# Altium footprint library texas.PCBLIB: 168 footprints (part 4 of 14)
Each footprint in its own frame and in the unit in brackets; x right, y up, seen from the top. Pads: shape width x height; smd on the part's side, far side on the other; paste and mask are expansions set on the pad; w line width, h text height; cw(c..) or ccw(c..) is an arc to the next point about the centre after c.
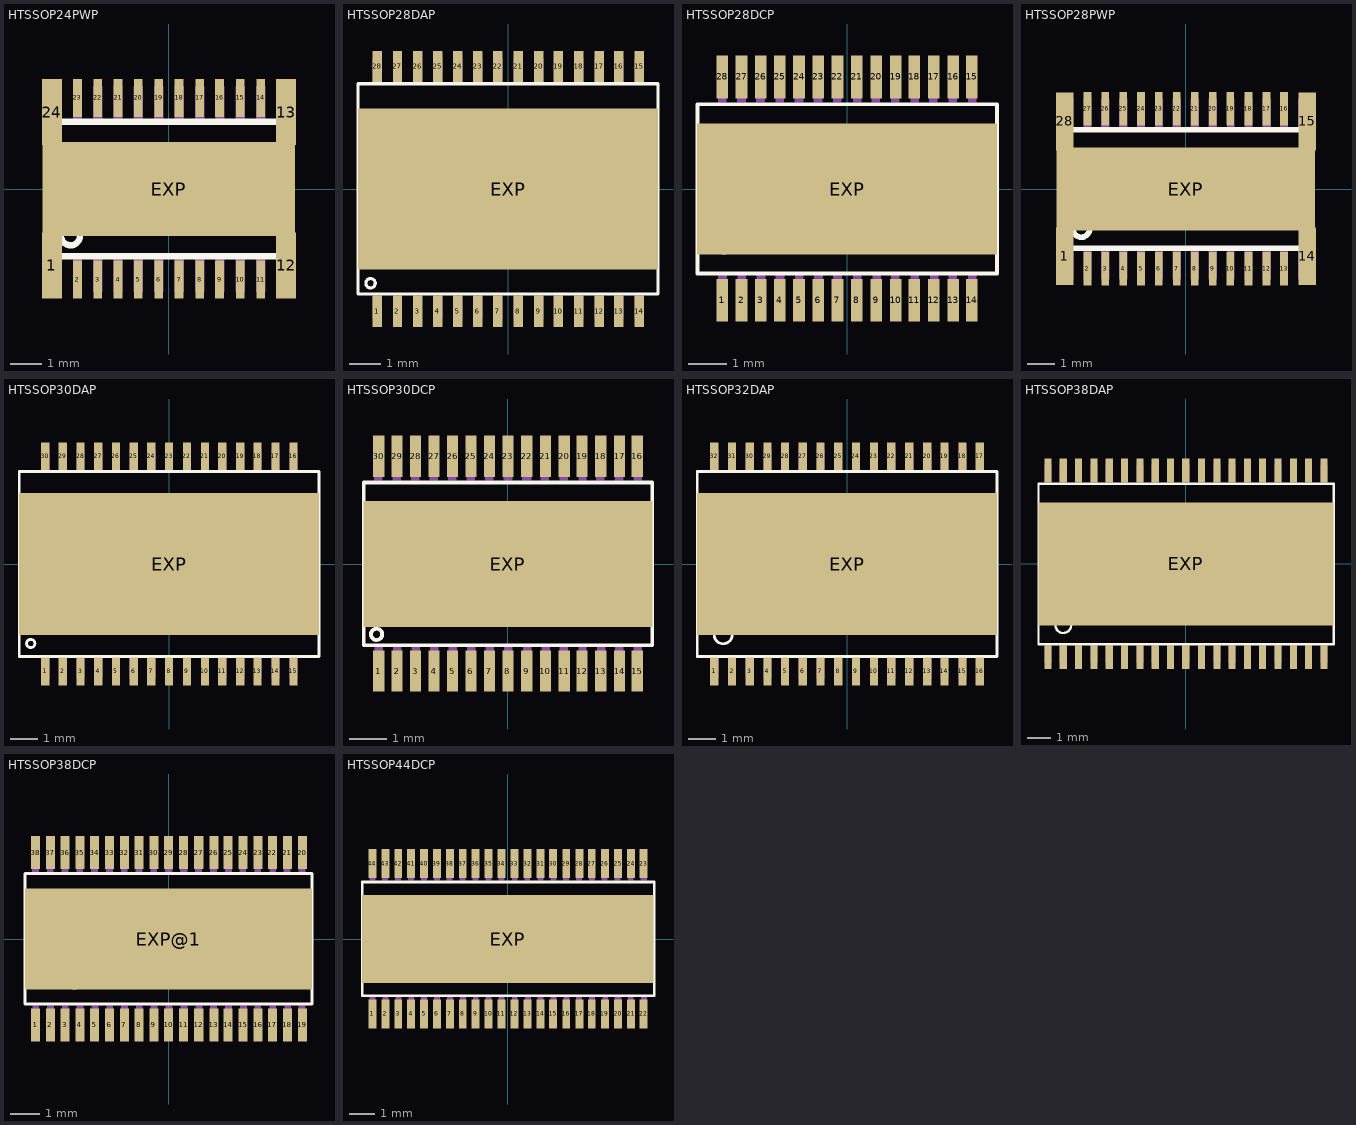
[diagram p3: the footprints below, top view; thin cyan lines are the x and y axes]

## HTSSOP24PWP [mil]
pads (25):
  rect 25x83 smd: 1(-147.44,-96.46) 12(148,-96.46) 13(148,97) 24(-147.44,97)
  rect 11x48 smd: 2(-115.16,-114.17) 3(-89.57,-114.17) 4(-63.98,-114.17) 5(-38.39,-114.17) 6(-12.8,-114.17) 7(13,-114.17) 8(39,-114.17) 9(64,-114.17) 10(90,-114.17) 11(116,-114.17) 14(116,115) 15(90,115) 16(64,115) 17(39,115) 18(13,115) 19(-12.8,115) 20(-38.39,115) 21(-63.98,115) 22(-89.57,115) 23(-115.16,115)
  rect 319x119 smd: EXP(0,0)
Top Overlay:
  circle w8: c-124.02,-59.06 r12
  lines w8: -151.57,-84.65 -151.57,85 152,85 152,-84.65 -151.57,-84.65
Top Paste:
  region: -135.83,138 -145.67,138 -145.67,91 -135.83,91
  region: -110.24,138 -120.08,138 -120.08,91 -110.24,91
  region: -84.65,138 -94.49,138 -94.49,91 -84.65,91
  region: -59.06,138 -68.9,138 -68.9,91 -59.06,91
  region: -33.46,138 -43.31,138 -43.31,91 -33.46,91
  region: -7.87,138 -17.72,138 -17.72,91 -7.87,91
  region: 18,138 8,138 8,91 18,91
  region: 44,138 34,138 34,91 44,91
  region: 69,138 60,138 60,91 69,91
  region: 95,138 85,138 85,91 95,91
  region: 121,138 111,138 111,91 121,91
  region: 146,138 136,138 136,91 146,91
  rectangle: 136,-137.01 146,-90.94
  rectangle: 111,-137.01 121,-90.94
  rectangle: 85,-137.01 95,-90.94
  rectangle: 60,-137.01 69,-90.94
  rectangle: 34,-137.01 44,-90.94
  rectangle: 8,-137.01 18,-90.94
  rectangle: -17.72,-137.01 -7.87,-90.94
  rectangle: -43.31,-137.01 -33.46,-90.94
  rectangle: -68.9,-137.01 -59.06,-90.94
  rectangle: -94.49,-137.01 -84.65,-90.94
  rectangle: -120.08,-137.01 -110.24,-90.94
  rectangle: -145.67,-137.01 -135.83,-90.94
  rectangle: -94.49,-47.24 95,48
Top Solder:
  rectangle: -100,-51.18 100,52
  region: -135.43,138 -146.06,138 -146.06,91 -135.43,91
  region: -109.84,138 -120.47,138 -120.47,91 -109.84,91
  region: -84.25,138 -94.88,138 -94.88,91 -84.25,91
  region: -58.66,138 -69.29,138 -69.29,91 -58.66,91
  region: -33.07,138 -43.7,138 -43.7,91 -33.07,91
  region: -7.48,138 -18.11,138 -18.11,91 -7.48,91
  region: 19,138 8,138 8,91 19,91
  region: 44,138 34,138 34,91 44,91
  region: 70,138 59,138 59,91 70,91
  region: 95,138 85,138 85,91 95,91
  region: 121,138 110,138 110,91 121,91
  region: 147,138 136,138 136,91 147,91
  rectangle: 136,-137.8 147,-90.55
  rectangle: 110,-137.8 121,-90.55
  rectangle: 85,-137.8 95,-90.55
  rectangle: 59,-137.8 70,-90.55
  rectangle: 34,-137.8 44,-90.55
  rectangle: 8,-137.8 19,-90.55
  rectangle: -18.11,-137.8 -7.48,-90.55
  rectangle: -43.7,-137.8 -33.07,-90.55
  rectangle: -69.29,-137.8 -58.66,-90.55
  rectangle: -94.88,-137.8 -84.25,-90.55
  rectangle: -120.47,-137.8 -109.84,-90.55
  rectangle: -146.06,-137.8 -135.43,-90.55
Mechanical 4:
  region: -134.84,130 -146.65,130 -146.65,87 -134.84,87
  region: -109.25,130 -121.06,130 -121.06,87 -109.25,87
  region: -83.66,130 -95.47,130 -95.47,87 -83.66,87
  region: -58.07,130 -69.88,130 -69.88,87 -58.07,87
  region: -32.48,130 -44.29,130 -44.29,87 -32.48,87
  region: -6.89,130 -18.7,130 -18.7,87 -6.89,87
  region: 19,130 7,130 7,87 19,87
  region: 45,130 33,130 33,87 45,87
  region: 70,130 59,130 59,87 70,87
  region: 96,130 84,130 84,87 96,87
  region: 122,130 110,130 110,87 122,87
  region: 147,130 135,130 135,87 147,87
  rectangle: 135,-129.92 147,-86.61
  rectangle: 110,-129.92 122,-86.61
  rectangle: 84,-129.92 96,-86.61
  rectangle: 59,-129.92 70,-86.61
  rectangle: 33,-129.92 45,-86.61
  rectangle: 7,-129.92 19,-86.61
  rectangle: -18.7,-129.92 -6.89,-86.61
  rectangle: -44.29,-129.92 -32.48,-86.61
  rectangle: -69.88,-129.92 -58.07,-86.61
  rectangle: -95.47,-129.92 -83.66,-86.61
  rectangle: -121.06,-129.92 -109.25,-86.61
  rectangle: -146.65,-129.92 -134.84,-86.61

## HTSSOP28DAP [mil]
pads (29):
  rect 12x40 smd: 1(-166.34,-155.51) 2(-140.75,-155.51) 3(-115.16,-155.51) 4(-89.57,-155.51) 5(-63.98,-155.51) 6(-38.39,-155.51) 7(-12.8,-155.51) 8(13,-155.51) 9(39,-155.51) 10(64,-155.51) 11(90,-155.51) 12(116,-155.51) 13(141,-155.51) 14(167,-155.51) 15(167,156) 16(141,156) 17(116,156) 18(90,156) 19(64,156) 20(39,156) 21(13,156) 22(-12.8,156) 23(-38.39,156) 24(-63.98,156) 25(-89.57,156) 26(-115.16,156) 27(-140.75,156) 28(-166.34,156)
  rect 382x205 smd: EXP(0,0)
Top Overlay:
  circle w4: c-175,-120 r6
  lines w4: -190.94,-133.86 -190.94,134 191,134 191,-133.86 -190.94,-133.86
Top Solder:
  rectangle: -190.94,-102.36 191,103
  region: -160.63,175 -172.05,175 -172.05,137 -160.63,137
  region: -160.04,176 -172.64,176 -172.64,136 -160.04,136
  region: -135.04,175 -146.46,175 -146.46,137 -135.04,137
  region: -134.45,176 -147.05,176 -147.05,136 -134.45,136
  region: -109.45,175 -120.87,175 -120.87,137 -109.45,137
  region: -108.86,176 -121.46,176 -121.46,136 -108.86,136
  region: -83.86,175 -95.28,175 -95.28,137 -83.86,137
  region: -83.27,176 -95.87,176 -95.87,136 -83.27,136
  region: -58.27,175 -69.69,175 -69.69,137 -58.27,137
  region: -57.68,176 -70.28,176 -70.28,136 -57.68,136
  region: -32.68,175 -44.09,175 -44.09,137 -32.68,137
  region: -32.09,176 -44.69,176 -44.69,136 -32.09,136
  region: -7.09,175 -18.5,175 -18.5,137 -7.09,137
  region: -6.5,176 -19.09,176 -19.09,136 -6.5,136
  region: 19,175 8,175 8,137 19,137
  region: 20,176 7,176 7,136 20,136
  region: 45,175 33,175 33,137 45,137
  region: 45,176 33,176 33,136 45,136
  region: 70,175 59,175 59,137 70,137
  region: 71,176 58,176 58,136 71,136
  region: 96,175 84,175 84,137 96,137
  region: 96,176 84,176 84,136 96,136
  region: 121,175 110,175 110,137 121,137
  region: 122,176 109,176 109,136 122,136
  region: 147,175 136,175 136,137 147,137
  region: 148,176 135,176 135,136 148,136
  region: 173,175 161,175 161,137 173,137
  region: 173,176 161,176 161,136 173,136
  rectangle: 161,-175 173,-136.02
  rectangle: 161,-175.59 173,-135.43
  rectangle: 136,-175 147,-136.02
  rectangle: 135,-175.59 148,-135.43
  rectangle: 110,-175 121,-136.02
  rectangle: 109,-175.59 122,-135.43
  rectangle: 84,-175 96,-136.02
  rectangle: 84,-175.59 96,-135.43
  rectangle: 59,-175 70,-136.02
  rectangle: 58,-175.59 71,-135.43
  rectangle: 33,-175 45,-136.02
  rectangle: 33,-175.59 45,-135.43
  rectangle: 8,-175 19,-136.02
  rectangle: 7,-175.59 20,-135.43
  rectangle: -18.5,-175 -7.09,-136.02
  rectangle: -19.09,-175.59 -6.5,-135.43
  rectangle: -44.09,-175 -32.68,-136.02
  rectangle: -44.69,-175.59 -32.09,-135.43
  rectangle: -69.69,-175 -58.27,-136.02
  rectangle: -70.28,-175.59 -57.68,-135.43
  rectangle: -95.28,-175 -83.86,-136.02
  rectangle: -95.87,-175.59 -83.27,-135.43
  rectangle: -120.87,-175 -109.45,-136.02
  rectangle: -121.46,-175.59 -108.86,-135.43
  rectangle: -146.46,-175 -135.04,-136.02
  rectangle: -147.05,-175.59 -134.45,-135.43
  rectangle: -172.05,-175 -160.63,-136.02
  rectangle: -172.64,-175.59 -160.04,-135.43
Mechanical 4:
  region: -160.43,166 -172.24,166 -172.24,136 -160.43,136
  region: -134.84,166 -146.65,166 -146.65,136 -134.84,136
  region: -109.25,166 -121.06,166 -121.06,136 -109.25,136
  region: -83.66,166 -95.47,166 -95.47,136 -83.66,136
  region: -58.07,166 -69.88,166 -69.88,136 -58.07,136
  region: -32.48,166 -44.29,166 -44.29,136 -32.48,136
  region: -6.89,166 -18.7,166 -18.7,136 -6.89,136
  region: 19,166 7,166 7,136 19,136
  region: 45,166 33,166 33,136 45,136
  region: 70,166 59,166 59,136 70,136
  region: 96,166 84,166 84,136 96,136
  region: 122,166 110,166 110,136 122,136
  region: 147,166 135,166 135,136 147,136
  region: 173,166 161,166 161,136 173,136
  rectangle: 161,-165.35 173,-135.83
  rectangle: 135,-165.35 147,-135.83
  rectangle: 110,-165.35 122,-135.83
  rectangle: 84,-165.35 96,-135.83
  rectangle: 59,-165.35 70,-135.83
  rectangle: 33,-165.35 45,-135.83
  rectangle: 7,-165.35 19,-135.83
  rectangle: -18.7,-165.35 -6.89,-135.83
  rectangle: -44.29,-165.35 -32.48,-135.83
  rectangle: -69.88,-165.35 -58.07,-135.83
  rectangle: -95.47,-165.35 -83.66,-135.83
  rectangle: -121.06,-165.35 -109.25,-135.83
  rectangle: -146.65,-165.35 -134.84,-135.83
  rectangle: -172.24,-165.35 -160.43,-135.83

## HTSSOP28DCP [mil]
pads (29):
  rect 12x44 smd: 1(-127.95,-114.17) 2(-108.27,-114.17) 3(-88.58,-114.17) 4(-68.9,-114.17) 5(-49.21,-114.17) 6(-29.53,-114.17) 7(-9.84,-114.17) 8(10,-114.17) 9(30,-114.17) 10(50,-114.17) 11(69,-114.17) 12(89,-114.17) 13(109,-114.17) 14(128,-114.17) 15(128,115) 16(109,115) 17(89,115) 18(69,115) 19(50,115) 20(30,115) 21(10,115) 22(-9.84,115) 23(-29.53,115) 24(-49.21,115) 25(-68.9,115) 26(-88.58,115) 27(-108.27,115) 28(-127.95,115)
  rect 308x134 smd: EXP(0,0)
Top Overlay:
  circle w4: c-125.79,-53.15 r12
  lines w4: -153.54,-86.61 154,-86.61 154,87 -153.54,87 -153.54,-86.61
Top Paste:
  rectangle: -133.46,-135.24 -122.44,-93.11
  rectangle: -113.78,-135.24 -102.76,-93.11
  rectangle: -94.09,-135.24 -83.07,-93.11
  rectangle: -74.41,-135.24 -63.39,-93.11
  rectangle: -54.72,-135.24 -43.7,-93.11
  rectangle: -35.04,-135.24 -24.02,-93.11
  rectangle: -15.35,-135.24 -4.33,-93.11
  rectangle: 5,-135.24 16,-93.11
  rectangle: 25,-135.24 36,-93.11
  rectangle: 44,-135.24 55,-93.11
  rectangle: 64,-135.24 75,-93.11
  rectangle: 84,-135.24 95,-93.11
  rectangle: 103,-135.24 114,-93.11
  rectangle: 123,-135.24 134,-93.11
  region: 134,136 123,136 123,94 134,94
  region: 114,136 103,136 103,94 114,94
  region: 95,136 84,136 84,94 95,94
  region: 75,136 64,136 64,94 75,94
  region: 55,136 44,136 44,94 55,94
  region: 36,136 25,136 25,94 36,94
  region: 16,136 5,136 5,94 16,94
  region: -4.33,136 -15.35,136 -15.35,94 -4.33,94
  region: -24.02,136 -35.04,136 -35.04,94 -24.02,94
  region: -43.7,136 -54.72,136 -54.72,94 -43.7,94
  region: -63.39,136 -74.41,136 -74.41,94 -63.39,94
  region: -83.07,136 -94.09,136 -94.09,94 -83.07,94
  region: -102.76,136 -113.78,136 -113.78,94 -102.76,94
  region: -122.44,136 -133.46,136 -133.46,94 -122.44,94
Top Solder:
  rectangle: -134.06,-136.02 -121.85,-92.32
  rectangle: -114.37,-136.02 -102.17,-92.32
  rectangle: -94.69,-136.02 -82.48,-92.32
  rectangle: -75,-136.02 -62.8,-92.32
  rectangle: -55.31,-136.02 -43.11,-92.32
  rectangle: -35.63,-136.02 -23.43,-92.32
  rectangle: -15.94,-136.02 -3.74,-92.32
  rectangle: 4,-136.02 16,-92.32
  rectangle: 24,-136.02 36,-92.32
  rectangle: 44,-136.02 56,-92.32
  rectangle: 63,-136.02 75,-92.32
  rectangle: 83,-136.02 95,-92.32
  rectangle: 103,-136.02 115,-92.32
  rectangle: 122,-136.02 135,-92.32
  region: 135,137 122,137 122,93 135,93
  region: 115,137 103,137 103,93 115,93
  region: 95,137 83,137 83,93 95,93
  region: 75,137 63,137 63,93 75,93
  region: 56,137 44,137 44,93 56,93
  region: 36,137 24,137 24,93 36,93
  region: 16,137 4,137 4,93 16,93
  region: -3.74,137 -15.94,137 -15.94,93 -3.74,93
  region: -23.43,137 -35.63,137 -35.63,93 -23.43,93
  region: -43.11,137 -55.31,137 -55.31,93 -43.11,93
  region: -62.8,137 -75,137 -75,93 -62.8,93
  region: -82.48,137 -94.69,137 -94.69,93 -82.48,93
  region: -102.17,137 -114.37,137 -114.37,93 -102.17,93
  region: -121.85,137 -134.06,137 -134.06,93 -121.85,93
  rectangle: -153.35,-66.93 154,67
Mechanical 4:
  rectangle: -132.28,-129.92 -123.23,-88.39
  rectangle: -112.6,-129.92 -103.54,-88.39
  rectangle: -92.91,-129.92 -83.86,-88.39
  rectangle: -73.23,-129.92 -64.17,-88.39
  rectangle: -53.54,-129.92 -44.49,-88.39
  rectangle: -33.86,-129.92 -24.8,-88.39
  rectangle: -14.17,-129.92 -5.12,-88.39
  rectangle: 6,-129.92 15,-88.39
  rectangle: 26,-129.92 35,-88.39
  rectangle: 45,-129.92 54,-88.39
  rectangle: 65,-129.92 74,-88.39
  rectangle: 85,-129.92 94,-88.39
  rectangle: 104,-129.92 113,-88.39
  rectangle: 124,-129.92 133,-88.39
  region: 133,130 124,130 124,89 133,89
  region: 113,130 104,130 104,89 113,89
  region: 93,130 84,130 84,89 93,89
  region: 74,130 65,130 65,89 74,89
  region: 54,130 45,130 45,89 54,89
  region: 34,130 25,130 25,89 34,89
  region: 15,130 6,130 6,89 15,89
  region: -5.51,130 -14.57,130 -14.57,89 -5.51,89
  region: -25.2,130 -34.25,130 -34.25,89 -25.2,89
  region: -44.88,130 -53.94,130 -53.94,89 -44.88,89
  region: -64.57,130 -73.62,130 -73.62,89 -64.57,89
  region: -84.25,130 -93.31,130 -93.31,89 -84.25,89
  region: -103.94,130 -112.99,130 -112.99,89 -103.94,89
  region: -123.62,130 -132.68,130 -132.68,89 -123.62,89

## HTSSOP28PWP [mil]
pads (29):
  rect 25x83 smd: 1(-173.03,-96.46) 14(174,-96.46) 15(174,97) 28(-173.03,97)
  rect 11x48 smd: 2(-140.75,-114.17) 3(-115.16,-114.17) 4(-89.57,-114.17) 5(-63.98,-114.17) 6(-38.39,-114.17) 7(-12.8,-114.17) 8(13,-114.17) 9(39,-114.17) 10(64,-114.17) 11(90,-114.17) 12(116,-114.17) 13(141,-114.17) 16(141,115) 17(116,115) 18(90,115) 19(64,115) 20(39,115) 21(13,115) 22(-12.8,115) 23(-38.39,115) 24(-63.98,115) 25(-89.57,115) 26(-115.16,115) 27(-140.75,115)
  rect 371x119 smd: EXP(0,0)
Top Overlay:
  circle w8: c-149.61,-57.09 r12
  lines w8: -177.17,-84.65 178,-84.65 178,85 -177.17,85 -177.17,-84.65
Top Paste:
  rectangle: -171.26,-137.01 -161.42,-90.94
  rectangle: -145.67,-137.01 -135.83,-90.94
  rectangle: -120.08,-137.01 -110.24,-90.94
  rectangle: -94.49,-137.01 -84.65,-90.94
  rectangle: -68.9,-137.01 -59.06,-90.94
  rectangle: -43.31,-137.01 -33.46,-90.94
  rectangle: -17.72,-137.01 -7.87,-90.94
  rectangle: 8,-137.01 18,-90.94
  rectangle: 34,-137.01 44,-90.94
  rectangle: 60,-137.01 69,-90.94
  rectangle: 85,-137.01 95,-90.94
  rectangle: 111,-137.01 121,-90.94
  rectangle: 136,-137.01 146,-90.94
  rectangle: 162,-137.01 172,-90.94
  region: 172,138 162,138 162,91 172,91
  region: 146,138 136,138 136,91 146,91
  region: 121,138 111,138 111,91 121,91
  region: 95,138 85,138 85,91 95,91
  region: 69,138 60,138 60,91 69,91
  region: 44,138 34,138 34,91 44,91
  region: 18,138 8,138 8,91 18,91
  region: -7.87,138 -17.72,138 -17.72,91 -7.87,91
  region: -33.46,138 -43.31,138 -43.31,91 -33.46,91
  region: -59.06,138 -68.9,138 -68.9,91 -59.06,91
  region: -84.65,138 -94.49,138 -94.49,91 -84.65,91
  region: -110.24,138 -120.08,138 -120.08,91 -110.24,91
  region: -135.83,138 -145.67,138 -145.67,91 -135.83,91
  region: -161.42,138 -171.26,138 -171.26,91 -161.42,91
  rectangle: -122.05,-39.37 123,40
Top Solder:
  rectangle: -171.65,-137.8 -161.02,-90.55
  rectangle: -146.06,-137.8 -135.43,-90.55
  rectangle: -120.47,-137.8 -109.84,-90.55
  rectangle: -94.88,-137.8 -84.25,-90.55
  rectangle: -69.29,-137.8 -58.66,-90.55
  rectangle: -43.7,-137.8 -33.07,-90.55
  rectangle: -18.11,-137.8 -7.48,-90.55
  rectangle: 8,-137.8 19,-90.55
  rectangle: 34,-137.8 44,-90.55
  rectangle: 59,-137.8 70,-90.55
  rectangle: 85,-137.8 95,-90.55
  rectangle: 162,-137.8 172,-90.55
  region: 172,138 162,138 162,91 172,91
  region: 95,138 85,138 85,91 95,91
  region: 70,138 59,138 59,91 70,91
  region: 44,138 34,138 34,91 44,91
  region: 19,138 8,138 8,91 19,91
  region: -7.48,138 -18.11,138 -18.11,91 -7.48,91
  region: -33.07,138 -43.7,138 -43.7,91 -33.07,91
  region: -58.66,138 -69.29,138 -69.29,91 -58.66,91
  region: -84.25,138 -94.88,138 -94.88,91 -84.25,91
  region: -109.84,138 -120.47,138 -120.47,91 -109.84,91
  region: -135.43,138 -146.06,138 -146.06,91 -135.43,91
  region: -161.02,138 -171.65,138 -171.65,91 -161.02,91
  rectangle: -125.59,-43.31 126,44
  region: 121,138 110,138 110,91 121,91
  rectangle: 110,-137.8 121,-90.55
  region: 147,138 136,138 136,91 147,91
  rectangle: 136,-137.8 147,-90.55
Mechanical 4:
  rectangle: -172.24,-129.92 -160.43,-86.61
  rectangle: -146.65,-129.92 -134.84,-86.61
  rectangle: -121.06,-129.92 -109.25,-86.61
  rectangle: -95.47,-129.92 -83.66,-86.61
  rectangle: -69.88,-129.92 -58.07,-86.61
  rectangle: -44.29,-129.92 -32.48,-86.61
  rectangle: -18.7,-129.92 -6.89,-86.61
  rectangle: 7,-129.92 19,-86.61
  rectangle: 33,-129.92 45,-86.61
  rectangle: 59,-129.92 70,-86.61
  rectangle: 84,-129.92 96,-86.61
  rectangle: 161,-129.92 173,-86.61
  region: 173,130 161,130 161,87 173,87
  region: -160.43,130 -172.24,130 -172.24,87 -160.43,87
  rectangle: 110,-129.92 122,-86.61
  rectangle: 135,-129.92 147,-86.61
  region: 147,130 135,130 135,87 147,87
  region: 122,130 110,130 110,87 122,87
  region: 96,130 84,130 84,87 96,87
  region: 70,130 59,130 59,87 70,87
  region: 45,130 33,130 33,87 45,87
  region: 19,130 7,130 7,87 19,87
  region: -6.89,130 -18.7,130 -18.7,87 -6.89,87
  region: -32.48,130 -44.29,130 -44.29,87 -32.48,87
  region: -58.07,130 -69.88,130 -69.88,87 -58.07,87
  region: -83.66,130 -95.47,130 -95.47,87 -83.66,87
  region: -109.25,130 -121.06,130 -121.06,87 -109.25,87
  region: -134.84,130 -146.65,130 -146.65,87 -134.84,87

## HTSSOP30DAP [mil]
pads (31):
  rect 12x40 smd: 1(-179.13,-155.51) 2(-153.54,-155.51) 3(-127.95,-155.51) 4(-102.36,-155.51) 5(-76.77,-155.51) 6(-51.18,-155.51) 7(-25.59,-155.51) 8(0,-155.51) 9(26,-155.51) 10(52,-155.51) 11(77,-155.51) 12(103,-155.51) 13(128,-155.51) 14(154,-155.51) 15(180,-155.51) 16(180,156) 17(154,156) 18(128,156) 19(103,156) 20(77,156) 21(52,156) 22(26,156) 23(0,156) 24(-25.59,156) 25(-51.18,156) 26(-76.77,156) 27(-102.36,156) 28(-127.95,156) 29(-153.54,156) 30(-179.13,156)
  rect 434x205 smd: EXP(0,0)
Top Overlay:
  circle w4: c-200,-115 r6
  lines w4: -216.54,-133.86 217,-133.86 217,134 -216.54,134 -216.54,-133.86
Top Solder:
  rectangle: -185.43,-175.59 -172.83,-135.43
  rectangle: -184.84,-175 -173.43,-136.02
  rectangle: -159.84,-175.59 -147.24,-135.43
  rectangle: -159.25,-175 -147.83,-136.02
  rectangle: -134.25,-175.59 -121.65,-135.43
  rectangle: -133.66,-175 -122.24,-136.02
  rectangle: -108.66,-175.59 -96.06,-135.43
  rectangle: -108.07,-175 -96.65,-136.02
  rectangle: -83.07,-175.59 -70.47,-135.43
  rectangle: -82.48,-175 -71.06,-136.02
  rectangle: -57.48,-175.59 -44.88,-135.43
  rectangle: -56.89,-175 -45.47,-136.02
  rectangle: -31.89,-175.59 -19.29,-135.43
  rectangle: -31.3,-175 -19.88,-136.02
  rectangle: -6.3,-175.59 7,-135.43
  rectangle: -5.71,-175 6,-136.02
  rectangle: 20,-175.59 32,-135.43
  rectangle: 20,-175 32,-136.02
  rectangle: 45,-175.59 58,-135.43
  rectangle: 46,-175 57,-136.02
  rectangle: 71,-175.59 84,-135.43
  rectangle: 72,-175 83,-136.02
  rectangle: 97,-175.59 109,-135.43
  rectangle: 97,-175 109,-136.02
  rectangle: 122,-175.59 135,-135.43
  rectangle: 123,-175 134,-136.02
  rectangle: 148,-175.59 160,-135.43
  rectangle: 148,-175 160,-136.02
  rectangle: 173,-175.59 186,-135.43
  rectangle: 174,-175 185,-136.02
  region: 186,176 173,176 173,136 186,136
  region: 185,175 174,175 174,137 185,137
  region: 160,176 148,176 148,136 160,136
  region: 160,175 148,175 148,137 160,137
  region: 135,176 122,176 122,136 135,136
  region: 134,175 123,175 123,137 134,137
  region: 109,176 97,176 97,136 109,136
  region: 109,175 97,175 97,137 109,137
  region: 84,176 71,176 71,136 84,136
  region: 83,175 72,175 72,137 83,137
  region: 58,176 45,176 45,136 58,136
  region: 57,175 46,175 46,137 57,137
  region: 32,176 20,176 20,136 32,136
  region: 32,175 20,175 20,137 32,137
  region: 7,176 -6.3,176 -6.3,136 7,136
  region: 6,175 -5.71,175 -5.71,137 6,137
  region: -19.29,176 -31.89,176 -31.89,136 -19.29,136
  region: -19.88,175 -31.3,175 -31.3,137 -19.88,137
  region: -44.88,176 -57.48,176 -57.48,136 -44.88,136
  region: -45.47,175 -56.89,175 -56.89,137 -45.47,137
  region: -70.47,176 -83.07,176 -83.07,136 -70.47,136
  region: -71.06,175 -82.48,175 -82.48,137 -71.06,137
  region: -96.06,176 -108.66,176 -108.66,136 -96.06,136
  region: -96.65,175 -108.07,175 -108.07,137 -96.65,137
  region: -121.65,176 -134.25,176 -134.25,136 -121.65,136
  region: -122.24,175 -133.66,175 -133.66,137 -122.24,137
  region: -147.24,176 -159.84,176 -159.84,136 -147.24,136
  region: -147.83,175 -159.25,175 -159.25,137 -147.83,137
  region: -172.83,176 -185.43,176 -185.43,136 -172.83,136
  region: -173.43,175 -184.84,175 -184.84,137 -173.43,137
  rectangle: -216.54,-102.36 217,103
Mechanical 4:
  rectangle: -185.04,-165.35 -173.23,-135.83
  rectangle: -159.45,-165.35 -147.64,-135.83
  rectangle: -133.86,-165.35 -122.05,-135.83
  rectangle: -108.27,-165.35 -96.46,-135.83
  rectangle: -82.68,-165.35 -70.87,-135.83
  rectangle: -57.09,-165.35 -45.28,-135.83
  rectangle: -31.5,-165.35 -19.68,-135.83
  rectangle: -5.91,-165.35 6,-135.83
  rectangle: 20,-165.35 32,-135.83
  rectangle: 46,-165.35 58,-135.83
  rectangle: 71,-165.35 83,-135.83
  rectangle: 97,-165.35 109,-135.83
  rectangle: 123,-165.35 134,-135.83
  rectangle: 148,-165.35 160,-135.83
  rectangle: 174,-165.35 186,-135.83
  region: 186,166 174,166 174,136 186,136
  region: 160,166 148,166 148,136 160,136
  region: 134,166 123,166 123,136 134,136
  region: 109,166 97,166 97,136 109,136
  region: 83,166 71,166 71,136 83,136
  region: 58,166 46,166 46,136 58,136
  region: 32,166 20,166 20,136 32,136
  region: 6,166 -5.91,166 -5.91,136 6,136
  region: -19.68,166 -31.5,166 -31.5,136 -19.69,136
  region: -45.28,166 -57.09,166 -57.09,136 -45.28,136
  region: -70.87,166 -82.68,166 -82.68,136 -70.87,136
  region: -96.46,166 -108.27,166 -108.27,136 -96.46,136
  region: -122.05,166 -133.86,166 -133.86,136 -122.05,136
  region: -147.64,166 -159.45,166 -159.45,136 -147.64,136
  region: -173.23,166 -185.04,166 -185.04,136 -173.23,136

## HTSSOP30DCP [mil]
pads (31):
  rect 12x44 smd: 1(-137.8,-114.17) 2(-118.11,-114.17) 3(-98.43,-114.17) 4(-78.74,-114.17) 5(-59.06,-114.17) 6(-39.37,-114.17) 7(-19.68,-114.17) 8(0,-114.17) 9(20,-114.17) 10(40,-114.17) 11(60,-114.17) 12(79,-114.17) 13(99,-114.17) 14(119,-114.17) 15(138,-114.17) 16(138,115) 17(119,115) 18(99,115) 19(79,115) 20(60,115) 21(40,115) 22(20,115) 23(0,115) 24(-19.68,115) 25(-39.37,115) 26(-59.06,115) 27(-78.74,115) 28(-98.43,115) 29(-118.11,115) 30(-137.8,115)
  rect 308x134 smd: EXP(0,0)
Top Overlay:
  circle w4: c-140,-75 r6
  lines w4: -153.54,-86.61 -153.54,87 154,87 154,-86.61 -153.54,-86.61
Top Paste:
  region: -132.28,136 -143.31,136 -143.31,94 -132.28,94
  region: -112.6,136 -123.62,136 -123.62,94 -112.6,94
  region: -92.91,136 -103.94,136 -103.94,94 -92.91,94
  region: -73.23,136 -84.25,136 -84.25,94 -73.23,94
  region: -53.54,136 -64.57,136 -64.57,94 -53.54,94
  region: -33.86,136 -44.88,136 -44.88,94 -33.86,94
  region: -14.17,136 -25.2,136 -25.2,94 -14.17,94
  region: 6,136 -5.51,136 -5.51,94 6,94
  region: 26,136 15,136 15,94 26,94
  region: 45,136 34,136 34,94 45,94
  region: 65,136 54,136 54,94 65,94
  region: 85,136 74,136 74,94 85,94
  region: 104,136 93,136 93,94 104,94
  region: 124,136 113,136 113,94 124,94
  region: 144,136 133,136 133,94 144,94
  rectangle: 133,-135.24 144,-93.11
  rectangle: 113,-135.24 124,-93.11
  rectangle: 93,-135.24 104,-93.11
  rectangle: 74,-135.24 85,-93.11
  rectangle: 54,-135.24 65,-93.11
  rectangle: 34,-135.24 45,-93.11
  rectangle: 15,-135.24 26,-93.11
  rectangle: -5.51,-135.24 6,-93.11
  rectangle: -25.2,-135.24 -14.17,-93.11
  rectangle: -44.88,-135.24 -33.86,-93.11
  rectangle: -64.57,-135.24 -53.54,-93.11
  rectangle: -84.25,-135.24 -73.23,-93.11
  rectangle: -103.94,-135.24 -92.91,-93.11
  rectangle: -123.62,-135.24 -112.6,-93.11
  rectangle: -143.31,-135.24 -132.28,-93.11
Top Solder:
  region: -131.69,137 -143.9,137 -143.9,93 -131.69,93
  region: -112.01,137 -124.21,137 -124.21,93 -112.01,93
  rectangle: -153.35,-66.93 154,67
  region: -92.32,137 -104.53,137 -104.53,93 -92.32,93
  region: -72.64,137 -84.84,137 -84.84,93 -72.64,93
  region: -52.95,137 -65.16,137 -65.16,93 -52.95,93
  region: -33.27,137 -45.47,137 -45.47,93 -33.27,93
  region: -13.58,137 -25.79,137 -25.79,93 -13.58,93
  region: 7,137 -6.1,137 -6.1,93 7,93
  region: 26,137 14,137 14,93 26,93
  region: 46,137 34,137 34,93 46,93
  region: 66,137 53,137 53,93 66,93
  region: 85,137 73,137 73,93 85,93
  region: 105,137 93,137 93,93 105,93
  region: 125,137 113,137 113,93 125,93
  region: 144,137 132,137 132,93 144,93
  rectangle: 132,-136.02 144,-92.32
  rectangle: 113,-136.02 125,-92.32
  rectangle: 93,-136.02 105,-92.32
  rectangle: 73,-136.02 85,-92.32
  rectangle: 53,-136.02 66,-92.32
  rectangle: 34,-136.02 46,-92.32
  rectangle: 14,-136.02 26,-92.32
  rectangle: -6.1,-136.02 7,-92.32
  rectangle: -25.79,-136.02 -13.58,-92.32
  rectangle: -45.47,-136.02 -33.27,-92.32
  rectangle: -65.16,-136.02 -52.95,-92.32
  rectangle: -84.84,-136.02 -72.64,-92.32
  rectangle: -104.53,-136.02 -92.32,-92.32
  rectangle: -124.21,-136.02 -112.01,-92.32
  rectangle: -143.9,-136.02 -131.69,-92.32
Mechanical 4:
  region: -133.46,130 -142.52,130 -142.52,89 -133.46,89
  region: -113.78,130 -122.83,130 -122.83,89 -113.78,89
  region: -94.09,130 -103.15,130 -103.15,89 -94.09,89
  region: -74.41,130 -83.46,130 -83.46,89 -74.41,89
  region: -54.72,130 -63.78,130 -63.78,89 -54.72,89
  region: -35.04,130 -44.09,130 -44.09,89 -35.04,89
  region: -15.35,130 -24.41,130 -24.41,89 -15.35,89
  region: 5,130 -4.72,130 -4.72,89 5,89
  region: 25,130 15,130 15,89 25,89
  region: 44,130 35,130 35,89 44,89
  region: 64,130 55,130 55,89 64,89
  region: 84,130 75,130 75,89 84,89
  region: 103,130 94,130 94,89 103,89
  region: 123,130 114,130 114,89 123,89
  region: 143,130 134,130 134,89 143,89
  rectangle: 134,-129.92 143,-88.39
  rectangle: 114,-129.92 123,-88.39
  rectangle: 95,-129.92 104,-88.39
  rectangle: 75,-129.92 84,-88.39
  rectangle: 55,-129.92 64,-88.39
  rectangle: 36,-129.92 45,-88.39
  rectangle: 16,-129.92 25,-88.39
  rectangle: -4.33,-129.92 5,-88.39
  rectangle: -24.02,-129.92 -14.96,-88.39
  rectangle: -43.7,-129.92 -34.65,-88.39
  rectangle: -63.39,-129.92 -54.33,-88.39
  rectangle: -83.07,-129.92 -74.02,-88.39
  rectangle: -102.76,-129.92 -93.7,-88.39
  rectangle: -122.44,-129.92 -113.39,-88.39
  rectangle: -142.13,-129.92 -133.07,-88.39

## HTSSOP32DAP [mil]
pads (33):
  rect 12x40 smd: 1(-191.93,-155.51) 2(-166.34,-155.51) 3(-140.75,-155.51) 4(-115.16,-155.51) 5(-89.57,-155.51) 6(-63.98,-155.51) 7(-38.39,-155.51) 8(-12.8,-155.51) 9(13,-155.51) 10(39,-155.51) 11(64,-155.51) 12(90,-155.51) 13(116,-155.51) 14(141,-155.51) 15(167,-155.51) 16(192,-155.51) 17(192,156) 18(167,156) 19(141,156) 20(116,156) 21(90,156) 22(64,156) 23(39,156) 24(13,156) 25(-12.8,156) 26(-38.39,156) 27(-63.98,156) 28(-89.57,156) 29(-115.16,156) 30(-140.75,156) 31(-166.34,156) 32(-191.93,156)
  rect 434x205 smd: EXP(0,0)
Top Overlay:
  circle w4: c-179.13,-102.36 r13
  lines w4: -216.54,-133.86 -216.54,134 217,134 217,-133.86 -216.54,-133.86
Top Solder:
  region: -186.22,175 -197.64,175 -197.64,137 -186.22,137
  region: -185.63,176 -198.23,176 -198.23,136 -185.63,136
  region: -160.63,175 -172.05,175 -172.05,137 -160.63,137
  region: -160.04,176 -172.64,176 -172.64,136 -160.04,136
  region: -135.04,175 -146.46,175 -146.46,137 -135.04,137
  region: -134.45,176 -147.05,176 -147.05,136 -134.45,136
  region: -109.45,175 -120.87,175 -120.87,137 -109.45,137
  region: -108.86,176 -121.46,176 -121.46,136 -108.86,136
  rectangle: -216.54,-102.36 217,103
  region: -83.86,175 -95.28,175 -95.28,137 -83.86,137
  region: -83.27,176 -95.87,176 -95.87,136 -83.27,136
  region: -58.27,175 -69.69,175 -69.69,137 -58.27,137
  region: -57.68,176 -70.28,176 -70.28,136 -57.68,136
  region: -32.68,175 -44.09,175 -44.09,137 -32.68,137
  region: -32.09,176 -44.69,176 -44.69,136 -32.09,136
  region: -7.09,175 -18.5,175 -18.5,137 -7.09,137
  region: -6.5,176 -19.09,176 -19.09,136 -6.5,136
  region: 19,175 8,175 8,137 19,137
  region: 20,176 7,176 7,136 20,136
  region: 45,175 33,175 33,137 45,137
  region: 45,176 33,176 33,136 45,136
  region: 70,175 59,175 59,137 70,137
  region: 71,176 58,176 58,136 71,136
  region: 96,175 84,175 84,137 96,137
  region: 96,176 84,176 84,136 96,136
  region: 121,175 110,175 110,137 121,137
  region: 122,176 109,176 109,136 122,136
  region: 147,175 136,175 136,137 147,137
  region: 148,176 135,176 135,136 148,136
  region: 173,175 161,175 161,137 173,137
  region: 173,176 161,176 161,136 173,136
  region: 198,175 187,175 187,137 198,137
  region: 199,176 186,176 186,136 199,136
  rectangle: 187,-175 198,-136.02
  rectangle: 186,-175.59 199,-135.43
  rectangle: 161,-175 173,-136.02
  rectangle: 161,-175.59 173,-135.43
  rectangle: 136,-175 147,-136.02
  rectangle: 135,-175.59 148,-135.43
  rectangle: 110,-175 121,-136.02
  rectangle: 109,-175.59 122,-135.43
  rectangle: 84,-175 96,-136.02
  rectangle: 84,-175.59 96,-135.43
  rectangle: 59,-175 70,-136.02
  rectangle: 58,-175.59 71,-135.43
  rectangle: 33,-175 45,-136.02
  rectangle: 33,-175.59 45,-135.43
  rectangle: 8,-175 19,-136.02
  rectangle: 7,-175.59 20,-135.43
  rectangle: -18.5,-175 -7.09,-136.02
  rectangle: -19.09,-175.59 -6.5,-135.43
  rectangle: -44.09,-175 -32.68,-136.02
  rectangle: -44.69,-175.59 -32.09,-135.43
  rectangle: -69.69,-175 -58.27,-136.02
  rectangle: -70.28,-175.59 -57.68,-135.43
  rectangle: -95.28,-175 -83.86,-136.02
  rectangle: -95.87,-175.59 -83.27,-135.43
  rectangle: -120.87,-175 -109.45,-136.02
  rectangle: -121.46,-175.59 -108.86,-135.43
  rectangle: -146.46,-175 -135.04,-136.02
  rectangle: -147.05,-175.59 -134.45,-135.43
  rectangle: -172.05,-175 -160.63,-136.02
  rectangle: -172.64,-175.59 -160.04,-135.43
  rectangle: -197.64,-175 -186.22,-136.02
  rectangle: -198.23,-175.59 -185.63,-135.43
Mechanical 4:
  region: -186.02,166 -197.83,166 -197.83,136 -186.02,136
  region: -160.43,166 -172.24,166 -172.24,136 -160.43,136
  region: -134.84,166 -146.65,166 -146.65,136 -134.84,136
  region: -109.25,166 -121.06,166 -121.06,136 -109.25,136
  region: -83.66,166 -95.47,166 -95.47,136 -83.66,136
  region: -58.07,166 -69.88,166 -69.88,136 -58.07,136
  region: -32.48,166 -44.29,166 -44.29,136 -32.48,136
  region: -6.89,166 -18.7,166 -18.7,136 -6.89,136
  region: 19,166 7,166 7,136 19,136
  region: 45,166 33,166 33,136 45,136
  region: 70,166 59,166 59,136 70,136
  region: 96,166 84,166 84,136 96,136
  region: 122,166 110,166 110,136 122,136
  region: 147,166 135,166 135,136 147,136
  region: 173,166 161,166 161,136 173,136
  region: 198,166 187,166 187,136 198,136
  rectangle: 187,-165.35 198,-135.83
  rectangle: 161,-165.35 173,-135.83
  rectangle: 135,-165.35 147,-135.83
  rectangle: 110,-165.35 122,-135.83
  rectangle: 84,-165.35 96,-135.83
  rectangle: 59,-165.35 70,-135.83
  rectangle: 33,-165.35 45,-135.83
  rectangle: 7,-165.35 19,-135.83
  rectangle: -18.7,-165.35 -6.89,-135.83
  rectangle: -44.29,-165.35 -32.48,-135.83
  rectangle: -69.88,-165.35 -58.07,-135.83
  rectangle: -95.47,-165.35 -83.66,-135.83
  rectangle: -121.06,-165.35 -109.25,-135.83
  rectangle: -146.65,-165.35 -134.84,-135.83
  rectangle: -172.24,-165.35 -160.43,-135.83
  rectangle: -197.83,-165.35 -186.02,-135.83

## HTSSOP38DAP [mil]
pads (39):
  rect 12x40 smd: 1(-230.31,-155.51) 2(-204.72,-155.51) 3(-179.13,-155.51) 4(-153.54,-155.51) 5(-127.95,-155.51) 6(-102.36,-155.51) 7(-76.77,-155.51) 8(-51.18,-155.51) 9(-25.59,-155.51) 10(0,-155.51) 11(26,-155.51) 12(52,-155.51) 13(77,-155.51) 14(103,-155.51) 15(128,-155.51) 16(154,-155.51) 17(180,-155.51) 18(205,-155.51) 19(231,-155.51) 20(231,156) 21(205,156) 22(180,156) 23(154,156) 24(128,156) 25(103,156) 26(77,156) 27(52,156) 28(26,156) 29(0,156) 30(-25.59,156) 31(-51.18,156) 32(-76.77,156) 33(-102.36,156) 34(-127.95,156) 35(-153.54,156) 36(-179.13,156) 37(-204.72,156) 38(-230.31,156)
  rect 493x205 smd: EXP(0,0)
Top Overlay:
  circle w4: c-204.72,-102.36 r13
  lines w4: -246.06,-133.86 -246.06,134 247,134 247,-133.86 -246.06,-133.86
Top Solder:
  region: -224.61,175 -236.02,175 -236.02,137 -224.61,137
  region: -224.02,176 -236.61,176 -236.61,136 -224.02,136
  region: -199.02,175 -210.43,175 -210.43,137 -199.02,137
  region: -198.43,176 -211.02,176 -211.02,136 -198.43,136
  region: -173.43,175 -184.84,175 -184.84,137 -173.43,137
  region: -172.83,176 -185.43,176 -185.43,136 -172.83,136
  region: -147.83,175 -159.25,175 -159.25,137 -147.83,137
  region: -147.24,176 -159.84,176 -159.84,136 -147.24,136
  region: -122.24,175 -133.66,175 -133.66,137 -122.24,137
  region: -121.65,176 -134.25,176 -134.25,136 -121.65,136
  region: -96.65,175 -108.07,175 -108.07,137 -96.65,137
  region: -96.06,176 -108.66,176 -108.66,136 -96.06,136
  region: -71.06,175 -82.48,175 -82.48,137 -71.06,137
  region: -70.47,176 -83.07,176 -83.07,136 -70.47,136
  region: -45.47,175 -56.89,175 -56.89,137 -45.47,137
  region: -44.88,176 -57.48,176 -57.48,136 -44.88,136
  region: -19.88,175 -31.3,175 -31.3,137 -19.88,137
  region: -19.29,176 -31.89,176 -31.89,136 -19.29,136
  region: 6,175 -5.71,175 -5.71,137 6,137
  region: 7,176 -6.3,176 -6.3,136 7,136
  region: 32,175 20,175 20,137 32,137
  region: 32,176 20,176 20,136 32,136
  region: 57,175 46,175 46,137 57,137
  region: 58,176 45,176 45,136 58,136
  region: 83,175 72,175 72,137 83,137
  region: 84,176 71,176 71,136 84,136
  region: 109,175 97,175 97,137 109,137
  region: 109,176 97,176 97,136 109,136
  region: 134,175 123,175 123,137 134,137
  region: 135,176 122,176 122,136 135,136
  region: 160,175 148,175 148,137 160,137
  region: 160,176 148,176 148,136 160,136
  region: 185,175 174,175 174,137 185,137
  region: 186,176 173,176 173,136 186,136
  region: 211,175 200,175 200,137 211,137
  region: 212,176 199,176 199,136 212,136
  region: 237,175 225,175 225,137 237,137
  region: 237,176 225,176 225,136 237,136
  rectangle: 225,-175 237,-136.02
  rectangle: 225,-175.59 237,-135.43
  rectangle: 200,-175 211,-136.02
  rectangle: 199,-175.59 212,-135.43
  rectangle: 174,-175 185,-136.02
  rectangle: 173,-175.59 186,-135.43
  rectangle: -246.06,-102.36 247,103
  rectangle: 148,-175 160,-136.02
  rectangle: 148,-175.59 160,-135.43
  rectangle: 123,-175 134,-136.02
  rectangle: 122,-175.59 135,-135.43
  rectangle: 97,-175 109,-136.02
  rectangle: 97,-175.59 109,-135.43
  rectangle: 72,-175 83,-136.02
  rectangle: 71,-175.59 84,-135.43
  rectangle: 46,-175 57,-136.02
  rectangle: 45,-175.59 58,-135.43
  rectangle: 20,-175 32,-136.02
  rectangle: 20,-175.59 32,-135.43
  rectangle: -5.71,-175 6,-136.02
  rectangle: -6.3,-175.59 7,-135.43
  rectangle: -31.3,-175 -19.88,-136.02
  rectangle: -31.89,-175.59 -19.29,-135.43
  rectangle: -56.89,-175 -45.47,-136.02
  rectangle: -57.48,-175.59 -44.88,-135.43
  rectangle: -82.48,-175 -71.06,-136.02
  rectangle: -83.07,-175.59 -70.47,-135.43
  rectangle: -108.07,-175 -96.65,-136.02
  rectangle: -108.66,-175.59 -96.06,-135.43
  rectangle: -133.66,-175 -122.24,-136.02
  rectangle: -134.25,-175.59 -121.65,-135.43
  rectangle: -159.25,-175 -147.83,-136.02
  rectangle: -159.84,-175.59 -147.24,-135.43
  rectangle: -184.84,-175 -173.43,-136.02
  rectangle: -185.43,-175.59 -172.83,-135.43
  rectangle: -210.43,-175 -199.02,-136.02
  rectangle: -211.02,-175.59 -198.43,-135.43
  rectangle: -236.02,-175 -224.61,-136.02
  rectangle: -236.61,-175.59 -224.02,-135.43
Mechanical 4:
  region: -224.41,166 -236.22,166 -236.22,136 -224.41,136
  region: -198.82,166 -210.63,166 -210.63,136 -198.82,136
  region: -173.23,166 -185.04,166 -185.04,136 -173.23,136
  region: -147.64,166 -159.45,166 -159.45,136 -147.64,136
  region: -122.05,166 -133.86,166 -133.86,136 -122.05,136
  region: -96.46,166 -108.27,166 -108.27,136 -96.46,136
  region: -70.87,166 -82.68,166 -82.68,136 -70.87,136
  region: -45.28,166 -57.09,166 -57.09,136 -45.28,136
  region: -19.68,166 -31.5,166 -31.5,136 -19.69,136
  region: 6,166 -5.91,166 -5.91,136 6,136
  region: 32,166 20,166 20,136 32,136
  region: 58,166 46,166 46,136 58,136
  region: 83,166 71,166 71,136 83,136
  region: 109,166 97,166 97,136 109,136
  region: 134,166 123,166 123,136 134,136
  region: 160,166 148,166 148,136 160,136
  region: 186,166 174,166 174,136 186,136
  region: 211,166 199,166 199,136 211,136
  region: 237,166 225,166 225,136 237,136
  rectangle: 225,-165.35 237,-135.83
  rectangle: 199,-165.35 211,-135.83
  rectangle: 174,-165.35 186,-135.83
  rectangle: 148,-165.35 160,-135.83
  rectangle: 123,-165.35 134,-135.83
  rectangle: 97,-165.35 109,-135.83
  rectangle: 71,-165.35 83,-135.83
  rectangle: 46,-165.35 58,-135.83
  rectangle: 20,-165.35 32,-135.83
  rectangle: -5.91,-165.35 6,-135.83
  rectangle: -31.5,-165.35 -19.68,-135.83
  rectangle: -57.09,-165.35 -45.28,-135.83
  rectangle: -82.68,-165.35 -70.87,-135.83
  rectangle: -108.27,-165.35 -96.46,-135.83
  rectangle: -133.86,-165.35 -122.05,-135.83
  rectangle: -159.45,-165.35 -147.64,-135.83
  rectangle: -185.04,-165.35 -173.23,-135.83
  rectangle: -210.63,-165.35 -198.82,-135.83
  rectangle: -236.22,-165.35 -224.41,-135.83

## HTSSOP38DCP [mil]
pads (39):
  rect 12x44 smd: 1(-177.17,-114.17) 2(-157.48,-114.17) 3(-137.8,-114.17) 4(-118.11,-114.17) 5(-98.43,-114.17) 6(-78.74,-114.17) 7(-59.06,-114.17) 8(-39.37,-114.17) 9(-19.68,-114.17) 10(0,-114.17) 11(20,-114.17) 12(40,-114.17) 13(60,-114.17) 14(79,-114.17) 15(99,-114.17) 16(119,-114.17) 17(138,-114.17) 18(158,-114.17) 19(178,-114.17) 20(178,115) 21(158,115) 22(138,115) 23(119,115) 24(99,115) 25(79,115) 26(60,115) 27(40,115) 28(20,115) 29(0,115) 30(-19.68,115) 31(-39.37,115) 32(-59.06,115) 33(-78.74,115) 34(-98.43,115) 35(-118.11,115) 36(-137.8,115) 37(-157.48,115) 38(-177.17,115)
  rect 382x134 smd: EXP@1(0,0)
Top Overlay:
  circle w4: c-125.79,-53.15 r12
  lines w4: -190.94,-86.61 191,-86.61 191,87 -190.94,87 -190.94,-86.61
Top Paste:
  rectangle: -182.68,-135.24 -171.65,-93.11
  rectangle: -162.99,-135.24 -151.97,-93.11
  rectangle: -143.31,-135.24 -132.28,-93.11
  rectangle: -123.62,-135.24 -112.6,-93.11
  rectangle: -103.94,-135.24 -92.91,-93.11
  rectangle: -84.25,-135.24 -73.23,-93.11
  rectangle: -64.57,-135.24 -53.54,-93.11
  rectangle: -44.88,-135.24 -33.86,-93.11
  rectangle: -25.2,-135.24 -14.17,-93.11
  rectangle: -5.51,-135.24 6,-93.11
  rectangle: 15,-135.24 26,-93.11
  rectangle: 34,-135.24 45,-93.11
  rectangle: 54,-135.24 65,-93.11
  rectangle: 74,-135.24 85,-93.11
  rectangle: 93,-135.24 104,-93.11
  rectangle: 113,-135.24 124,-93.11
  rectangle: 133,-135.24 144,-93.11
  rectangle: 152,-135.24 163,-93.11
  rectangle: 172,-135.24 183,-93.11
  region: 183,136 172,136 172,94 183,94
  region: 163,136 152,136 152,94 163,94
  region: 144,136 133,136 133,94 144,94
  region: 124,136 113,136 113,94 124,94
  region: 104,136 93,136 93,94 104,94
  region: 85,136 74,136 74,94 85,94
  region: 65,136 54,136 54,94 65,94
  region: 45,136 34,136 34,94 45,94
  region: 26,136 15,136 15,94 26,94
  region: 6,136 -5.51,136 -5.51,94 6,94
  region: -14.17,136 -25.2,136 -25.2,94 -14.17,94
  region: -33.86,136 -44.88,136 -44.88,94 -33.86,94
  region: -53.54,136 -64.57,136 -64.57,94 -53.54,94
  region: -73.23,136 -84.25,136 -84.25,94 -73.23,94
  region: -92.91,136 -103.94,136 -103.94,94 -92.91,94
  region: -112.6,136 -123.62,136 -123.62,94 -112.6,94
  region: -132.28,136 -143.31,136 -143.31,94 -132.28,94
  region: -151.97,136 -162.99,136 -162.99,94 -151.97,94
  region: -171.65,136 -182.68,136 -182.68,94 -171.65,94
Top Solder:
  rectangle: -183.27,-136.02 -171.06,-92.32
  rectangle: -163.58,-136.02 -151.38,-92.32
  rectangle: -143.9,-136.02 -131.69,-92.32
  rectangle: -124.21,-136.02 -112.01,-92.32
  rectangle: -104.53,-136.02 -92.32,-92.32
  rectangle: -84.84,-136.02 -72.64,-92.32
  rectangle: -65.16,-136.02 -52.95,-92.32
  rectangle: -45.47,-136.02 -33.27,-92.32
  rectangle: -25.79,-136.02 -13.58,-92.32
  rectangle: -6.1,-136.02 7,-92.32
  rectangle: 14,-136.02 26,-92.32
  rectangle: 34,-136.02 46,-92.32
  rectangle: 53,-136.02 66,-92.32
  rectangle: 73,-136.02 85,-92.32
  rectangle: 93,-136.02 105,-92.32
  rectangle: 113,-136.02 125,-92.32
  rectangle: 132,-136.02 144,-92.32
  rectangle: 152,-136.02 164,-92.32
  rectangle: 172,-136.02 184,-92.32
  region: 184,137 172,137 172,93 184,93
  region: 164,137 152,137 152,93 164,93
  region: 144,137 132,137 132,93 144,93
  region: 125,137 113,137 113,93 125,93
  region: 105,137 93,137 93,93 105,93
  region: 85,137 73,137 73,93 85,93
  region: 66,137 53,137 53,93 66,93
  region: 46,137 34,137 34,93 46,93
  region: 26,137 14,137 14,93 26,93
  rectangle: -190.94,-66.93 191,67
  region: 7,137 -6.1,137 -6.1,93 7,93
  region: -13.58,137 -25.79,137 -25.79,93 -13.58,93
  region: -33.27,137 -45.47,137 -45.47,93 -33.27,93
  region: -52.95,137 -65.16,137 -65.16,93 -52.95,93
  region: -72.64,137 -84.84,137 -84.84,93 -72.64,93
  region: -92.32,137 -104.53,137 -104.53,93 -92.32,93
  region: -112.01,137 -124.21,137 -124.21,93 -112.01,93
  region: -131.69,137 -143.9,137 -143.9,93 -131.69,93
  region: -151.38,137 -163.58,137 -163.58,93 -151.38,93
  region: -171.06,137 -183.27,137 -183.27,93 -171.06,93
Mechanical 4:
  rectangle: -181.5,-129.92 -172.44,-88.39
  rectangle: -161.81,-129.92 -152.76,-88.39
  rectangle: -142.13,-129.92 -133.07,-88.39
  rectangle: -122.44,-129.92 -113.39,-88.39
  rectangle: -102.76,-129.92 -93.7,-88.39
  rectangle: -83.07,-129.92 -74.02,-88.39
  rectangle: -63.39,-129.92 -54.33,-88.39
  rectangle: -43.7,-129.92 -34.65,-88.39
  rectangle: -24.02,-129.92 -14.96,-88.39
  rectangle: -4.33,-129.92 5,-88.39
  rectangle: 16,-129.92 25,-88.39
  rectangle: 36,-129.92 45,-88.39
  rectangle: 55,-129.92 64,-88.39
  rectangle: 75,-129.92 84,-88.39
  rectangle: 95,-129.92 104,-88.39
  rectangle: 114,-129.92 123,-88.39
  rectangle: 134,-129.92 143,-88.39
  rectangle: 154,-129.92 163,-88.39
  rectangle: 173,-129.92 182,-88.39
  region: 182,130 173,130 173,89 182,89
  region: 162,130 153,130 153,89 162,89
  region: 143,130 134,130 134,89 143,89
  region: 123,130 114,130 114,89 123,89
  region: 103,130 94,130 94,89 103,89
  region: 84,130 75,130 75,89 84,89
  region: 64,130 55,130 55,89 64,89
  region: 44,130 35,130 35,89 44,89
  region: 25,130 15,130 15,89 25,89
  region: 5,130 -4.72,130 -4.72,89 5,89
  region: -15.35,130 -24.41,130 -24.41,89 -15.35,89
  region: -35.04,130 -44.09,130 -44.09,89 -35.04,89
  region: -54.72,130 -63.78,130 -63.78,89 -54.72,89
  region: -74.41,130 -83.46,130 -83.46,89 -74.41,89
  region: -94.09,130 -103.15,130 -103.15,89 -94.09,89
  region: -113.78,130 -122.83,130 -122.83,89 -113.78,89
  region: -133.46,130 -142.52,130 -142.52,89 -133.46,89
  region: -153.15,130 -162.2,130 -162.2,89 -153.15,89
  region: -172.83,130 -181.89,130 -181.89,89 -172.83,89

## HTSSOP44DCP [mil]
pads (45):
  rect 12x44 smd: 1(-206.69,-114.17) 2(-187.01,-114.17) 3(-167.32,-114.17) 4(-147.64,-114.17) 5(-127.95,-114.17) 6(-108.27,-114.17) 7(-88.58,-114.17) 8(-68.9,-114.17) 9(-49.21,-114.17) 10(-29.53,-114.17) 11(-9.84,-114.17) 12(10,-114.17) 13(30,-114.17) 14(50,-114.17) 15(69,-114.17) 16(89,-114.17) 17(109,-114.17) 18(128,-114.17) 19(148,-114.17) 20(168,-114.17) 21(188,-114.17) 22(207,-114.17) 23(207,115) 24(188,115) 25(168,115) 26(148,115) 27(128,115) 28(109,115) 29(89,115) 30(69,115) 31(50,115) 32(30,115) 33(10,115) 34(-9.84,115) 35(-29.53,115) 36(-49.21,115) 37(-68.9,115) 38(-88.58,115) 39(-108.27,115) 40(-127.95,115) 41(-147.64,115) 42(-167.32,115) 43(-187.01,115) 44(-206.69,115)
  rect 445x134 smd: EXP(0,0)
Top Overlay:
  circle w4: c-184.84,-53.15 r12
  lines w4: -222.44,-86.61 -222.44,87 223,87 223,-86.61 -222.44,-86.61
Top Paste:
  region: -201.18,136 -212.2,136 -212.2,94 -201.18,94
  region: -181.5,136 -192.52,136 -192.52,94 -181.5,94
  region: -161.81,136 -172.83,136 -172.83,94 -161.81,94
  region: -142.13,136 -153.15,136 -153.15,94 -142.13,94
  region: -122.44,136 -133.46,136 -133.46,94 -122.44,94
  region: -102.76,136 -113.78,136 -113.78,94 -102.76,94
  region: -83.07,136 -94.09,136 -94.09,94 -83.07,94
  region: -63.39,136 -74.41,136 -74.41,94 -63.39,94
  region: -43.7,136 -54.72,136 -54.72,94 -43.7,94
  region: -24.02,136 -35.04,136 -35.04,94 -24.02,94
  region: -4.33,136 -15.35,136 -15.35,94 -4.33,94
  region: 16,136 5,136 5,94 16,94
  region: 36,136 25,136 25,94 36,94
  region: 55,136 44,136 44,94 55,94
  region: 75,136 64,136 64,94 75,94
  region: 95,136 84,136 84,94 95,94
  region: 114,136 103,136 103,94 114,94
  region: 134,136 123,136 123,94 134,94
  region: 154,136 143,136 143,94 154,94
  region: 173,136 162,136 162,94 173,94
  region: 193,136 182,136 182,94 193,94
  region: 213,136 202,136 202,94 213,94
  rectangle: 202,-135.24 213,-93.11
  rectangle: 182,-135.24 193,-93.11
  rectangle: 162,-135.24 173,-93.11
  rectangle: 143,-135.24 154,-93.11
  rectangle: 123,-135.24 134,-93.11
  rectangle: 103,-135.24 114,-93.11
  rectangle: 84,-135.24 95,-93.11
  rectangle: 64,-135.24 75,-93.11
  rectangle: 44,-135.24 55,-93.11
  rectangle: 25,-135.24 36,-93.11
  rectangle: 5,-135.24 16,-93.11
  rectangle: -15.35,-135.24 -4.33,-93.11
  rectangle: -35.04,-135.24 -24.02,-93.11
  rectangle: -54.72,-135.24 -43.7,-93.11
  rectangle: -74.41,-135.24 -63.39,-93.11
  rectangle: -94.09,-135.24 -83.07,-93.11
  rectangle: -113.78,-135.24 -102.76,-93.11
  rectangle: -133.46,-135.24 -122.44,-93.11
  rectangle: -153.15,-135.24 -142.13,-93.11
  rectangle: -172.83,-135.24 -161.81,-93.11
  rectangle: -192.52,-135.24 -181.5,-93.11
  rectangle: -212.2,-135.24 -201.18,-93.11
Top Solder:
  region: -200.59,137 -212.8,137 -212.8,93 -200.59,93
  region: -180.91,137 -193.11,137 -193.11,93 -180.91,93
  region: -161.22,137 -173.43,137 -173.43,93 -161.22,93
  region: -141.54,137 -153.74,137 -153.74,93 -141.54,93
  region: -121.85,137 -134.06,137 -134.06,93 -121.85,93
  region: -102.17,137 -114.37,137 -114.37,93 -102.17,93
  region: -82.48,137 -94.69,137 -94.69,93 -82.48,93
  region: -62.8,137 -75,137 -75,93 -62.8,93
  region: -43.11,137 -55.31,137 -55.31,93 -43.11,93
  region: -23.43,137 -35.63,137 -35.63,93 -23.43,93
  region: -3.74,137 -15.94,137 -15.94,93 -3.74,93
  region: 16,137 4,137 4,93 16,93
  region: 36,137 24,137 24,93 36,93
  region: 56,137 44,137 44,93 56,93
  region: 75,137 63,137 63,93 75,93
  region: 95,137 83,137 83,93 95,93
  rectangle: -222.44,-66.93 223,67
  region: 115,137 103,137 103,93 115,93
  region: 135,137 122,137 122,93 135,93
  region: 154,137 142,137 142,93 154,93
  region: 174,137 162,137 162,93 174,93
  region: 194,137 181,137 181,93 194,93
  region: 213,137 201,137 201,93 213,93
  rectangle: 201,-136.02 213,-92.32
  rectangle: 181,-136.02 194,-92.32
  rectangle: 162,-136.02 174,-92.32
  rectangle: 142,-136.02 154,-92.32
  rectangle: 122,-136.02 135,-92.32
  rectangle: 103,-136.02 115,-92.32
  rectangle: 83,-136.02 95,-92.32
  rectangle: 63,-136.02 75,-92.32
  rectangle: 44,-136.02 56,-92.32
  rectangle: 24,-136.02 36,-92.32
  rectangle: 4,-136.02 16,-92.32
  rectangle: -15.94,-136.02 -3.74,-92.32
  rectangle: -35.63,-136.02 -23.43,-92.32
  rectangle: -55.31,-136.02 -43.11,-92.32
  rectangle: -75,-136.02 -62.8,-92.32
  rectangle: -94.69,-136.02 -82.48,-92.32
  rectangle: -114.37,-136.02 -102.17,-92.32
  rectangle: -134.06,-136.02 -121.85,-92.32
  rectangle: -153.74,-136.02 -141.54,-92.32
  rectangle: -173.43,-136.02 -161.22,-92.32
  rectangle: -193.11,-136.02 -180.91,-92.32
  rectangle: -212.8,-136.02 -200.59,-92.32
Mechanical 4:
  region: -202.36,130 -211.42,130 -211.42,89 -202.36,89
  region: -182.68,130 -191.73,130 -191.73,89 -182.68,89
  region: -162.99,130 -172.05,130 -172.05,89 -162.99,89
  region: -143.31,130 -152.36,130 -152.36,89 -143.31,89
  region: -123.62,130 -132.68,130 -132.68,89 -123.62,89
  region: -103.94,130 -112.99,130 -112.99,89 -103.94,89
  region: -84.25,130 -93.31,130 -93.31,89 -84.25,89
  region: -64.57,130 -73.62,130 -73.62,89 -64.57,89
  region: -44.88,130 -53.94,130 -53.94,89 -44.88,89
  region: -25.2,130 -34.25,130 -34.25,89 -25.2,89
  region: -5.51,130 -14.57,130 -14.57,89 -5.51,89
  region: 15,130 6,130 6,89 15,89
  region: 34,130 25,130 25,89 34,89
  region: 54,130 45,130 45,89 54,89
  region: 74,130 65,130 65,89 74,89
  region: 93,130 84,130 84,89 93,89
  region: 113,130 104,130 104,89 113,89
  region: 133,130 124,130 124,89 133,89
  region: 152,130 143,130 143,89 152,89
  region: 172,130 163,130 163,89 172,89
  region: 192,130 183,130 183,89 192,89
  region: 212,130 202,130 202,89 212,89
  rectangle: 203,-129.92 212,-88.39
  rectangle: 183,-129.92 192,-88.39
  rectangle: 163,-129.92 173,-88.39
  rectangle: 144,-129.92 153,-88.39
  rectangle: 124,-129.92 133,-88.39
  rectangle: 104,-129.92 113,-88.39
  rectangle: 85,-129.92 94,-88.39
  rectangle: 65,-129.92 74,-88.39
  rectangle: 45,-129.92 54,-88.39
  rectangle: 26,-129.92 35,-88.39
  rectangle: 6,-129.92 15,-88.39
  rectangle: -14.17,-129.92 -5.12,-88.39
  rectangle: -33.86,-129.92 -24.8,-88.39
  rectangle: -53.54,-129.92 -44.49,-88.39
  rectangle: -73.23,-129.92 -64.17,-88.39
  rectangle: -92.91,-129.92 -83.86,-88.39
  rectangle: -112.6,-129.92 -103.54,-88.39
  rectangle: -132.28,-129.92 -123.23,-88.39
  rectangle: -151.97,-129.92 -142.91,-88.39
  rectangle: -171.65,-129.92 -162.6,-88.39
  rectangle: -191.34,-129.92 -182.28,-88.39
  rectangle: -211.02,-129.92 -201.97,-88.39